# Altium footprint library LUMI_Handy_Soldering_LIB.PcbLib: 562 footprints (part 27 of 36)
Each footprint in its own frame and in the unit in brackets; x right, y up, seen from the top. Pads: shape width x height; smd on the part's side, far side on the other; paste and mask are expansions set on the pad; w line width, h text height; cw(c..) or ccw(c..) is an arc to the next point about the centre after c.
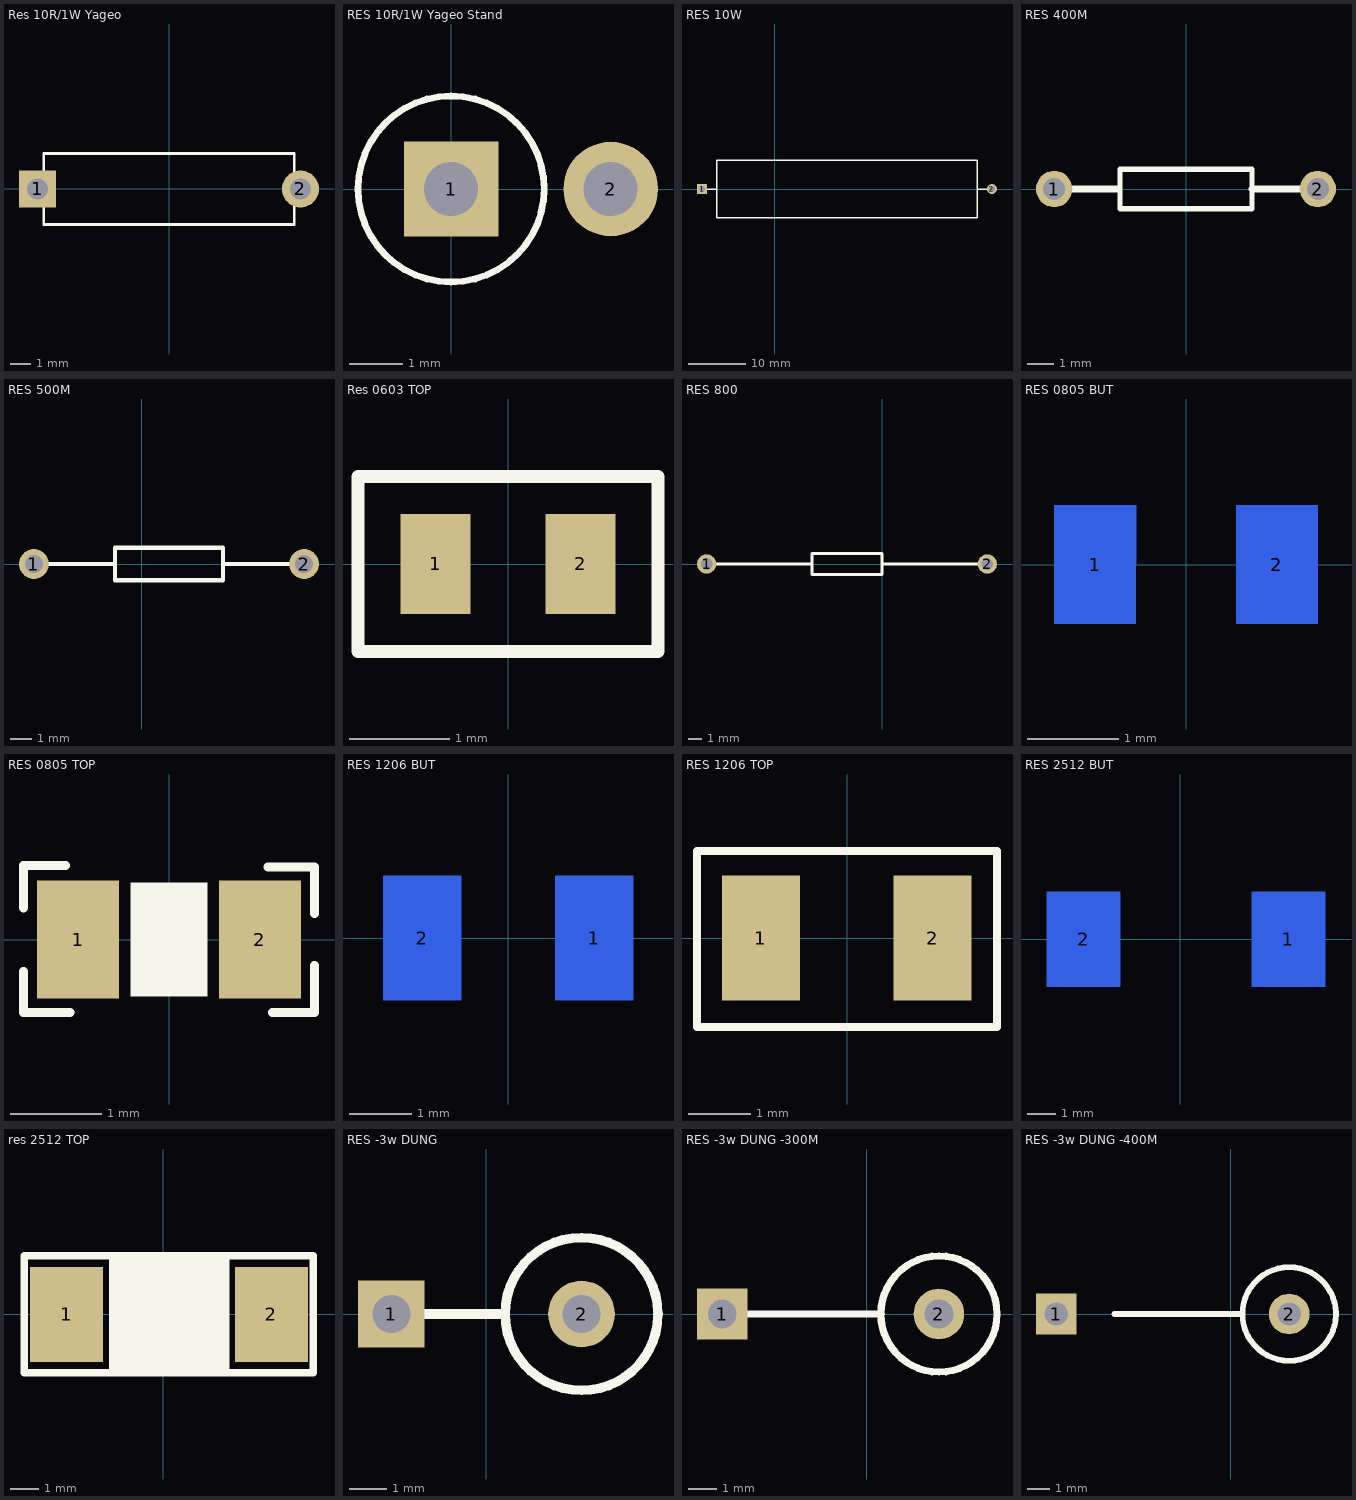
[diagram p26: the footprints below, top view; thin cyan lines are the x and y axes]

## Res 10R/1W Yageo [mil]
pads (2):
  rect 70x70 hole 40: 1(-248.03,0)
  round 70 hole 40: 2(248.03,0)
Top Overlay:
  lines w5: -236.22,-66.93 -236.22,66.93 236.22,66.93 236.22,-66.93 -236.22,-66.93
3D body: height 137.8, standoff -118.11, extent -258.66,-68.89 262.6,68.9

## RES 10R/1W Yageo Stand [mil]
pads (2):
  rect 70x70 hole 40: 1(0,0)
  round 70 hole 40: 2(118.11,0)
Top Overlay:
  circle w5: c0,0 r68.9

## RES 10W [mil] "Axial Device, Thru-Hole; 2 Leads; 0.3 in Pin Spacing"
height 60
pads (2):
  rect 70x70 hole 40: 1(-500,0)
  round 70 hole 40: 2(1500,0)
Top Overlay:
  lines w10: -500,0 -400,0 ; 1400,0 1500,0 ; -400,-200 -400,200 1400,200 1400,-200 -400,-200
3D body: height 271.26, standoff -169.69, extent -135.75,-135.59 1095.75,140

## RES 400M [mm] "Axial Device, Thru-Hole; 2 Leads; 0.3 in Pin Spacing"
height 1.524
pads (2):
  round 1.4 hole 0.85: 1(-5.08,0) 2(5.08,0)
Top Overlay:
  lines w0.2: -2.597,0 -2.54,0 ; 2.769,0 2.54,0 ; 2.54,0 2.54,-0.762 -2.54,-0.762 -2.54,0.762 2.54,0.762 2.54,0
  lines w0.254: -5.08,0 -2.597,0 ; 2.54,0 5.08,0
3D body: height 2.09, standoff -1.91, extent -4.05,-1 4.05,1

## RES 500M [mm] "Axial Device, Thru-Hole; 2 Leads; 0.3 in Pin Spacing"
height 1.524
pads (2):
  round 1.4 hole 0.85: 1(-5.08,0) 2(7.62,0)
Top Overlay:
  lines w0.2: -5.08,0 -1.27,0 ; 7.62,0 3.81,0 ; 3.81,0 3.81,-0.762 -1.27,-0.762 -1.27,0.762 3.81,0.762 3.81,0
3D body: height 2.09, standoff -1.91, extent -2.78,-1 5.32,1

## Res 0603 TOP [mm]
pads (2):
  rect 0.7x1 smd: 1(-0.725,0) 2(0.725,0)
Top Overlay:
  lines w0.127: -1.5,-0.875 -1.5,-0.15 -1.5,0.875 1.5,0.875 1.5,0.15 1.5,-0.875 -1.5,-0.875
3D body: height 0.3, standoff 0, extent -0.8,-0.4 0.8,0.4

## RES 800 [mm] "Axial Device, Thru-Hole; 2 Leads; 0.3 in Pin Spacing"
height 1.524
pads (2):
  round 1.4 hole 0.85: 1(-12.7,0) 2(7.62,0)
Top Overlay:
  lines w0.2: -12.7,0 -5.08,0 ; 7.62,0 0,0 ; 0,0 0,0.762 -5.08,0.762 -5.08,-0.762 0,-0.762 0,0
3D body: height 2.09, standoff -1.91, extent -6.59,-1 1.51,1

## RES 0805 BUT [mm]
pads (2):
  rect 0.9x1.3 smd far side: 1(-1,0) 2(1,0)
Bottom Overlay:
  rectangle: -0.425,-0.625 0.425,0.625
  lines w0.1: -1.6,-0.287 -1.6,-0.8 -1.137,-0.8 ; -1.6,0.287 -1.6,0.8 -1.087,0.8 ; 1.087,-0.8 1.6,-0.8 1.6,-0.35 ; 1.137,0.813 1.6,0.813 1.6,0.35
3D body: height 0.5, standoff 0, extent -1,-0.625 1,0.625

## RES 0805 TOP [mm]
pads (2):
  rect 0.9x1.3 smd: 1(-1,0) 2(1,0)
Top Overlay:
  region: 0.425,0.625 -0.425,0.625 -0.425,-0.625 0.425,-0.625
  lines w0.1: -1.6,-0.35 -1.6,-0.8 -1.087,-0.8 ; -1.6,0.35 -1.6,0.813 -1.137,0.813 ; 1.087,0.8 1.6,0.8 1.6,0.287 ; 1.137,-0.8 1.6,-0.8 1.6,-0.287
3D body: height 0.5, standoff 0, extent -1,-0.625 1,0.625

## RES 1206 BUT [mm]
pads (2):
  rect 1.25x2 smd far side: 1(1.375,0) 2(-1.375,0)
Bottom Overlay:
  lines w0.127: 2.4,1.394 -2.406,1.394 -2.406,0.875 -2.406,-0.875 -2.406,-1.425 -2.25,-1.425 2.4,-1.425 2.4,-0.875 2.4,0.875 2.4,1.394
3D body: height -0.41, standoff -0.96, extent -1.473,-0.8 1.727,0.8

## RES 1206 TOP [mm]
pads (2):
  rect 1.25x2 smd: 1(-1.381,0) 2(1.369,0)
Top Overlay:
  lines w0.127: -2.406,1.394 2.4,1.394 2.4,0.875 2.4,-0.875 2.4,-1.425 2.244,-1.425 -2.406,-1.425 -2.406,-0.875 -2.406,0.875 -2.406,1.394
3D body: height -0.41, standoff -0.96, extent -1.733,-0.8 1.467,0.8

## RES 2512 BUT [mil]
pads (2):
  rect 100x130 smd far side: 1(148,0) 2(-132,0)
Bottom Overlay:
  rectangle: -74,-79 91,81
  lines w10: -190,-80 205,-80 205,80 -190,80 -190,-80
3D body: height -15, standoff -78.07, extent -115.99,-59.05 134,59.07

## res 2512 TOP [mil]
pads (2):
  rect 100x130 smd: 1(-132,0) 2(148,0)
Top Overlay:
  rectangle: -74,-79 91,81
  lines w10: -190,-80 205,-80 205,80 -190,80 -190,-80
3D body: height 63.07, standoff 0, extent -115.99,-59.05 134,59.06

## RES -3w DUNG [mil] "Axial Device, Thru-Hole; 2 Leads; 0.3 in Pin Spacing"
height 60
pads (2):
  rect 70x70 hole 40: 1(-100,0)
  round 70 hole 40: 2(100,0)
Top Overlay:
  circle w10: c100,0 r80.4
  lines w10: -65,0 20,0
3D body: height 738.98, standoff -261.02, extent -112.6,-82.68 182.68,82.68

## RES -3w DUNG -300M [mil] "Axial Device, Thru-Hole; 2 Leads; 0.3 in Pin Spacing"
height 60
pads (2):
  rect 70x70 hole 40: 1(-200,0)
  round 70 hole 40: 2(100,0)
Top Overlay:
  circle w10: c100,0 r80.4
  lines w10: -200,0 20,0
3D body: height 738.98, standoff -261.02, extent -112.6,-82.68 182.68,82.68

## RES -3w DUNG -400M [mil] "Axial Device, Thru-Hole; 2 Leads; 0.3 in Pin Spacing"
height 60
pads (2):
  rect 70x70 hole 40: 1(-300,0)
  round 70 hole 40: 2(100,0)
Top Overlay:
  circle w10: c100,0 r80.4
  lines w10: -200,0 20,0
3D body: height 738.98, standoff -261.02, extent -237.6,-82.68 57.68,82.68